# Altium footprint library KwantLib.PcbLib: 249 footprints (part 2 of 16)
Each footprint in its own frame and in the unit in brackets; x right, y up, seen from the top. Pads: shape width x height; smd on the part's side, far side on the other; paste and mask are expansions set on the pad; w line width, h text height; cw(c..) or ccw(c..) is an arc to the next point about the centre after c.
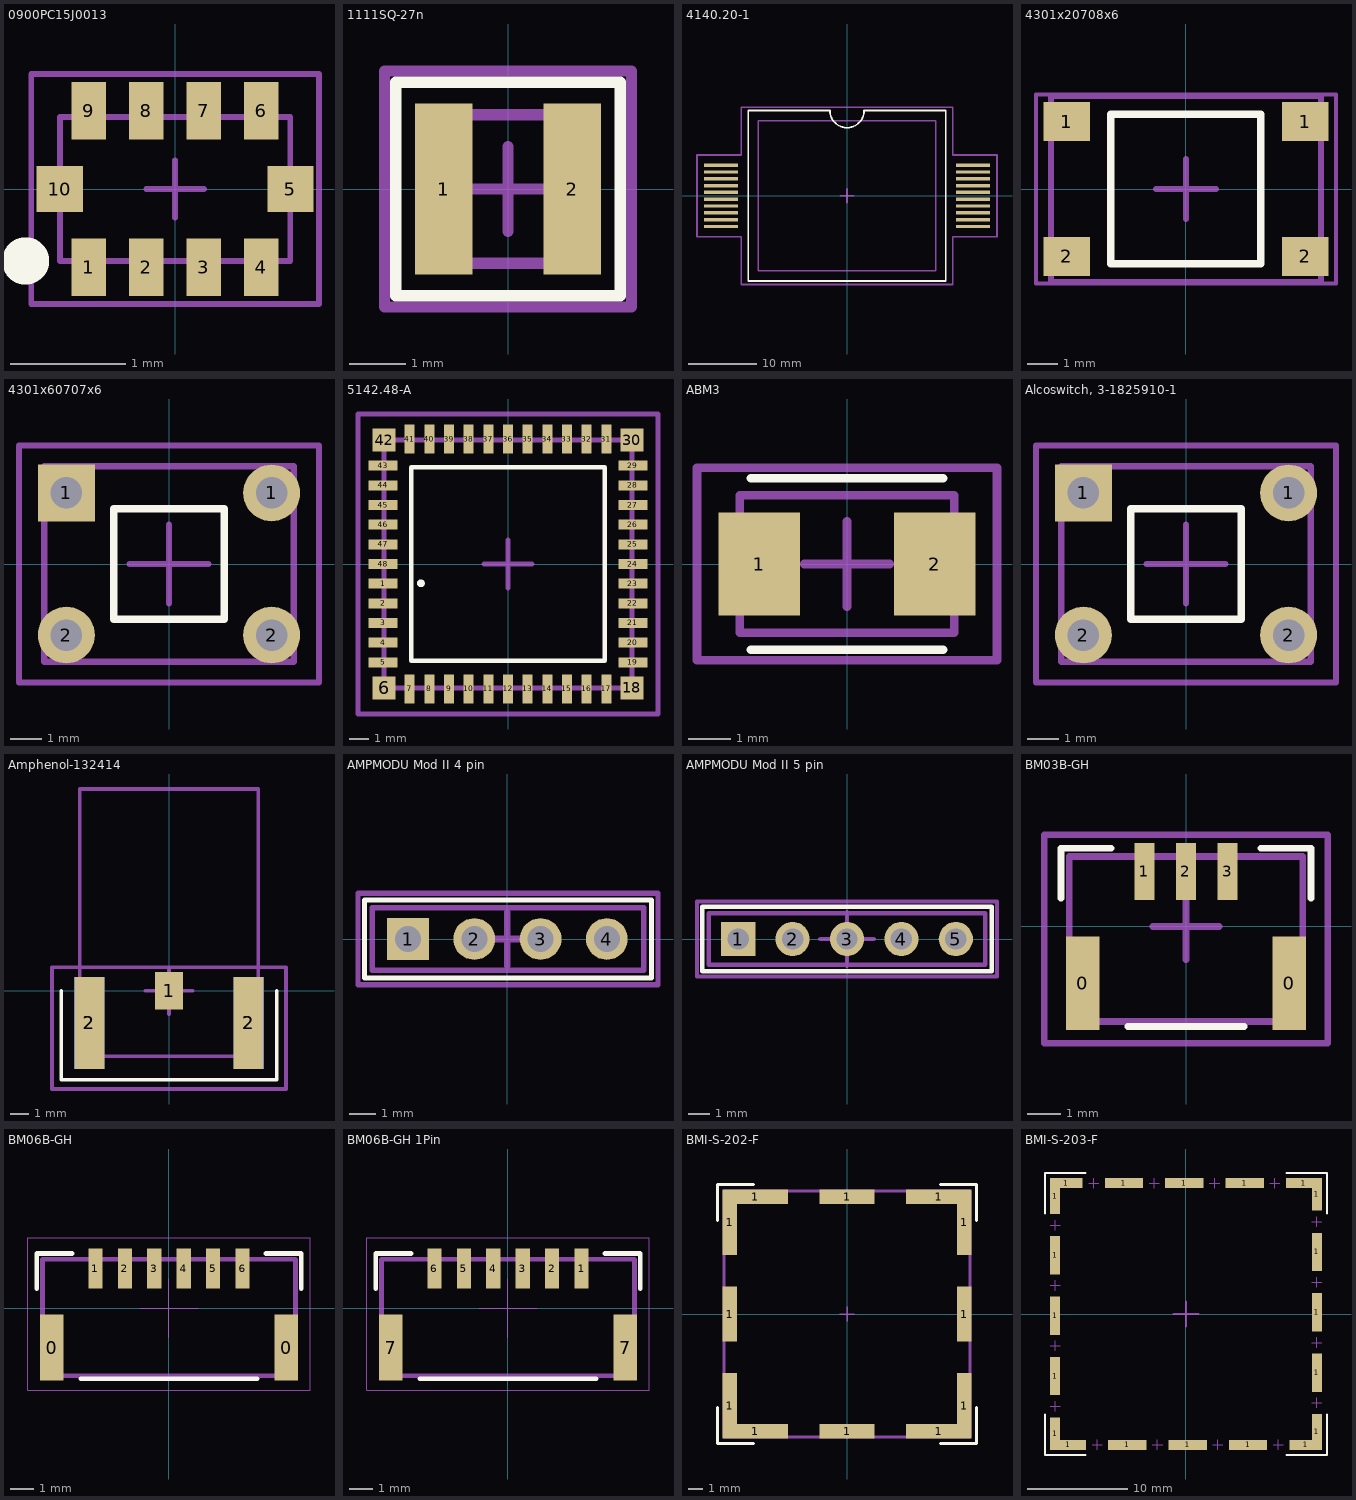
[diagram p1: the footprints below, top view; thin cyan lines are the x and y axes]

## 0900PC15J0013 [mm]
height 1
pads (10):
  rect 0.3x0.5 smd mask+0.07: 1(-0.75,-0.68) 2(-0.25,-0.68) 3(0.25,-0.68) 4(0.75,-0.68) 6(0.75,0.68) 7(0.25,0.68) 8(-0.25,0.68) 9(-0.75,0.68)
  rect 0.4x0.4 smd mask+0.07: 5(1.002,0) 10(-1.002,0)
Top Overlay:
  circle w0.3: c-1.3,-0.625 r0.056
Mechanical 13:
  lines w0.05: -1,-0.625 1,-0.625 1,0.625 -1,0.625 -1,-0.625
Mechanical 15:
  lines w0.05: -0.25,0 0.25,0 ; 0,-0.25 0,0.25 ; -1.25,-1 1.25,-1 1.25,1 -1.25,1 -1.25,-1
3D body "0900PC15J0013.stp": height 1.02, standoff 0, extent -1.01,-0.635 1.01,0.635

## 1111SQ-27n [mm] "Square Air Core Inductor - 27 nH"
height 3
pads (2):
  rect 1.02x3.05 smd: 1(-1.145,0) 2(1.145,0)
Top Overlay:
  lines w0.2: -2,-1.9 -2,1.9 2,1.9 2,-1.9 -2,-1.9
Mechanical 13:
  lines w0.2: -1.317,-1.321 1.318,-1.321 1.318,1.321 -1.317,1.321 -1.317,-1.321
Mechanical 15:
  lines w0.2: -0.75,0 0.75,0 ; 0,-0.75 0,0.75 ; -2.2,-2.1 2.2,-2.1 2.2,2.1 -2.2,2.1 -2.2,-2.1
3D body "1111SQ-27N.stp": height 2.82, standoff 0, extent -1.317,-1.321 1.318,1.321

## 4140.20-1 [mm]
height 7.12
pads (20):
  rect 5x0.5 smd: 1(-18.5,4.5) 2(-18.5,3.5) 3(-18.5,2.5) 4(-18.5,1.5) 5(-18.5,0.5) 6(-18.5,-0.5) 7(-18.5,-1.5) 8(-18.5,-2.5) 9(-18.5,-3.5) 10(-18.5,-4.5) 11(18.5,-4.5) 12(18.5,-3.5) 13(18.5,-2.5) 14(18.5,-1.5) 15(18.5,-0.5) 16(18.5,0.5) 17(18.5,1.5) 18(18.5,2.5) 19(18.5,3.5) 20(18.5,4.5)
Top Overlay:
  lines w0.25: -14.5,-12.5 14.5,-12.5 14.5,12.5 2.5,12.5 cw(c0,12.5) -2.5,12.5 -14.5,12.5 -14.5,-12.5
Mechanical 13:
  lines w0.25: -13,-11 13,-11 13,-3 13,11 -13,11 -13,-11
Mechanical 15:
  lines w0.25: -1,0 1,0 ; 0,-1 0,1 ; -22,-6 -15.5,-6 -15.5,-13 15.5,-13 15.5,-6 22,-6 22,6 15.5,6 15.5,13 -15.5,13 -15.5,6 -22,6 -22,-6
3D body: height 7.12, standoff 0.1, extent -13,-11 13,11

## 4301x20708x6 [mm] "6*6mm vertical type, SMD, height 7.0mm, white actuator, 260gf, T&R"
height 7
pads (4):
  rect 1.55x1.3 smd: 1(-3.975,2.25) 1(3.975,2.25) 2(-3.975,-2.25) 2(3.975,-2.25)
Top Overlay:
  lines w0.25: -2.5,-2.5 2.5,-2.5 2.5,2.5 -2.5,2.5 -2.5,-2.5
Mechanical 13:
  lines w0.2: -4.5,-3.1 -4.5,3.1 4.5,3.1 4.5,-3.1 -4.5,-3.1
Mechanical 15:
  lines w0.127: -5,-3.15 -5,3.15 5,3.15 5,-3.15 -5,-3.15
  lines w0.2: -1,0 1,0 ; 0,-1 0,1
3D body "4301x20708x6.stp": height 6.99, standoff -0.01, extent -4.5,-3.1 4.5,3.1

## 4301x60707x6 [mm] "6*6mm vertical type, THT, height 7.0mm, white actuator, 260gf, Bulk"
height 7
pads (4):
  rect 1.8x1.8 hole 1: 1(-3.25,2.25)
  round 1.8 hole 1: 1(3.25,2.25) 2(-3.25,-2.25) 2(3.25,-2.25)
Top Overlay:
  lines w0.25: -1.75,-1.75 -1.75,1.75 1.75,1.75 1.75,-1.75 -1.75,-1.75
Mechanical 13:
  lines w0.2: -3.947,-3.1 -3.947,3.1 3.947,3.1 3.947,-3.1 -3.947,-3.1
Mechanical 15:
  lines w0.2: -1.25,0 1.25,0 ; 0,-1.25 0,1.25 ; -4.75,-3.75 4.75,-3.75 4.75,3.75 -4.75,3.75 -4.75,-3.75
3D body "4301x60707x6.stp": height 7.01, standoff -3.49, extent -3.947,-3.1 3.947,3.1

## 5142.48-A [mm]
height 2.5
pads (48):
  rect 1.5x0.52 smd: 1(-6.45,-1.016) 2(-6.45,-2.032) 3(-6.45,-3.048) 4(-6.45,-4.064) 5(-6.45,-5.08) 19(6.45,-5.08) 20(6.45,-4.064) 21(6.45,-3.048) 22(6.45,-2.032) 23(6.45,-1.016) 24(6.45,0) 25(6.45,1.016) 26(6.45,2.032) 27(6.45,3.048) 28(6.45,4.064) 29(6.45,5.08) 43(-6.45,5.08) 44(-6.45,4.064) 45(-6.45,3.048) 46(-6.45,2.032) 47(-6.45,1.016) 48(-6.45,0)
  rect 1.2x1.2 smd: 6(-6.4,-6.4) 18(6.4,-6.4) 30(6.4,6.4) 42(-6.4,6.4)
  rect 0.52x1.5 smd: 7(-5.08,-6.45) 8(-4.064,-6.45) 9(-3.048,-6.45) 10(-2.032,-6.45) 11(-1.016,-6.45) 12(0,-6.45) 13(1.016,-6.45) 14(2.032,-6.45) 15(3.048,-6.45) 16(4.064,-6.45) 17(5.08,-6.45) 31(5.08,6.45) 32(4.064,6.45) 33(3.048,6.45) 34(2.032,6.45) 35(1.016,6.45) 36(0,6.45) 37(-1.016,6.45) 38(-2.032,6.45) 39(-3.048,6.45) 40(-4.064,6.45) 41(-5.08,6.45)
Top Overlay:
  circle w0.2: c-4.5,-1 r0.1
  lines w0.25: -5,-5 -5,5 5,5 5,-5 -5,-5
Mechanical 13:
  lines w0.25: -6.4,-6.4 6.4,-6.4 6.4,6.4 -6.4,6.4 -6.4,-6.4
Mechanical 15:
  lines w0.25: -1.25,0 1.25,0 ; 0,-1.25 0,1.25 ; -7.75,-7.75 -7.75,7.75 7.75,7.75 7.75,-7.75 -7.75,-7.75
3D body "514248а.STEP": height 2.5, standoff 0, extent -6.4,-6.35 6.3,6.35

## ABM3 [mm]
height 1.3
pads (2):
  rect 1.9x2.4 smd: 1(-2.05,0) 2(2.05,0)
Top Overlay:
  lines w0.2: -2.25,-2 2.25,-2 ; -2.25,2 2.25,2
Mechanical 13:
  lines w0.2: -2.5,-1.6 2.5,-1.6 2.5,1.6 -2.5,1.6 -2.5,-1.6
Mechanical 15:
  lines w0.2: -1,0 1,0 ; 0,-1 0,1 ; -3.5,-2.25 -3.5,2.25 3.5,2.25 3.5,-2.25 -3.5,-2.25
3D body "ABM3.STEP": height 1.31, standoff 0.01, extent -2.5,-1.6 2.5,1.6

## Alcoswitch, 3-1825910-1 [mm] "6*6mm vertical type, THT, height 17 mm, 160gf, Bulk"
height 17
pads (4):
  rect 1.8x1.8 hole 1: 1(-3.25,2.25)
  round 1.8 hole 1: 1(3.25,2.25) 2(-3.25,-2.25) 2(3.25,-2.25)
Top Overlay:
  lines w0.25: -1.75,-1.75 1.75,-1.75 1.75,1.75 -1.75,1.75 -1.75,-1.75
Mechanical 13:
  lines w0.2: -3.947,-3.1 3.947,-3.1 3.947,3.1 -3.947,3.1 -3.947,-3.1
Mechanical 15:
  lines w0.2: -1.25,0 1.25,0 ; 0,-1.25 0,1.25 ; -4.75,-3.75 -4.75,3.75 4.75,3.75 4.75,-3.75 -4.75,-3.75
3D body "c-3-1825910-1-c-3d.stp": height 17, standoff -3.51, extent -3.9,-2.995 3.9,2.995

## Amphenol-132414 [mm] "SMA Edge connector"
pads (5):
  rect 1.5x2 smd: 1(0,0)
  rect 1.6x4.9 smd: 2(-4.25,-1.725) 2(4.25,-1.725)
  rect 1.6x4.9 smd far side: 2(-4.25,-1.725) 2(4.25,-1.725)
Top Overlay:
  lines w0.2: -5.75,0 -5.75,-4.75 5.75,-4.75 5.75,0
Mechanical 13:
  lines w0.2: -4.76,-3.5 4.76,-3.5 4.76,10.77 -4.76,10.77 -4.76,-3.5
Mechanical 15:
  lines w0.2: -1.25,0 1.25,0 ; 0,-1.25 0,1.25 ; -6.25,-5.25 -6.25,1.25 6.25,1.25 6.25,-5.25 -6.25,-5.25
3D body "Amphenol-132414.stp": height 4.06, standoff -3.86, extent -4.76,-3.5 4.76,10.77

## AMPMODU Mod II 4 pin [mm]
pads (4):
  rect 1.6x1.6 hole 1: 1(-3.81,0)
  round 1.6 hole 1: 2(-1.27,0) 3(1.27,0) 4(3.81,0)
Top Overlay:
  lines w0.2: -5.48,-1.5 5.52,-1.5 5.52,1.5 -5.48,1.5 -5.48,-1.5
Mechanical 13:
  lines w0.2: -5.18,-1.2 5.22,-1.2 5.22,1.2 -5.18,1.2 -5.18,-1.2
Mechanical 15:
  lines w0.2: -5.73,-1.75 -5.73,1.75 5.77,1.75 5.77,-1.75 -5.73,-1.75
  lines w0.25: -1.016,0 1.016,0 ; 0,-1.016 0,1.016
3D body "PLD-4.stp": height 8, standoff -3, extent -5.08,-1.27 5.08,1.27

## AMPMODU Mod II 5 pin [mm]
pads (5):
  rect 1.6x1.6 hole 1: 1(-5.08,0)
  round 1.6 hole 1: 2(-2.54,0) 3(0,0) 4(2.54,0) 5(5.08,0)
Top Overlay:
  lines w0.2: -6.75,-1.5 6.75,-1.5 6.75,1.5 -6.75,1.5 -6.75,-1.5
Mechanical 13:
  lines w0.2: -6.45,-1.2 6.45,-1.2 6.45,1.2 -6.45,1.2 -6.45,-1.2
Mechanical 15:
  lines w0.2: -1.25,0 1.25,0 ; 0,-1.25 0,1.25 ; -7,-1.75 -7,1.75 7,1.75 7,-1.75 -7,-1.75
3D body "PLD-5.stp": height 8, standoff -3, extent -6.35,-1.27 6.35,1.27

## BM03B-GH [mm]
height 4.05
pads (5):
  rect 1x2.8 smd: 0(-3.1,-1.7) 0(3.1,-1.7)
  rect 0.6x1.7 smd: 1(-1.25,1.65) 2(0,1.65) 3(1.25,1.65)
Top Overlay:
  lines w0.2: -3.75,0.85 -3.75,2.35 -2.25,2.35 ; -1.75,-3 1.75,-3 ; 2.25,2.35 3.75,2.35 3.75,0.85
Mechanical 13:
  lines w0.2: -3.5,-2.85 -3.5,2.1 3.5,2.1 3.5,-2.85 -3.5,-2.85
Mechanical 15:
  lines w0.2: -1,0 1,0 ; 0,-1 0,1 ; -4.25,-3.5 4.25,-3.5 4.25,2.75 -4.25,2.75 -4.25,-3.5
3D body "BM03B-GHS-TBT.STEP": height 4.18, standoff -0.03, extent -3.5,-2.85 3.5,2.1

## BM06B-GH [mm]
height 4.05
pads (8):
  rect 1x2.8 smd paste-0.05: 0(-4.975,-1.675) 0(4.975,-1.675)
  rect 0.6x1.7 smd paste-0.05: 1(-3.125,1.675) 2(-1.875,1.675) 3(-0.625,1.675) 4(0.625,1.675) 5(1.875,1.675) 6(3.125,1.675)
Top Overlay:
  lines w0.2: -5.625,0.825 -5.625,2.325 -4.125,2.325 ; -3.75,-3 3.75,-3 ; 4.125,2.325 5.625,2.325 5.625,0.825
Mechanical 13:
  lines w0.2: -5.375,-2.875 -5.375,2.075 5.375,2.075 5.375,-2.875 -5.375,-2.875
Mechanical 15:
  lines w0.05: -1.25,0 1.25,0 ; 0,-1.25 0,1.25 ; -6,-3.5 6,-3.5 6,3 -6,3 -6,-3.5
3D body "BM06B-GHS-TBT.STEP": height 4.18, standoff -0.03, extent -5.375,-2.875 5.375,2.075

## BM06B-GH 1Pin [mm] "BM06B-GH С правильным расположением выводов"
height 4.05
pads (8):
  rect 0.6x1.7 smd paste-0.05: 1(3.125,1.675) 2(1.875,1.675) 3(0.625,1.675) 4(-0.625,1.675) 5(-1.875,1.675) 6(-3.125,1.675)
  rect 1x2.8 smd paste-0.05: 7(-4.975,-1.675) 7(4.975,-1.675)
Top Overlay:
  lines w0.2: -5.625,0.825 -5.625,2.325 -4.125,2.325 ; -3.75,-3 3.75,-3 ; 4.125,2.325 5.625,2.325 5.625,0.825
Mechanical 13:
  lines w0.2: -5.375,-2.875 -5.375,2.075 5.375,2.075 5.375,-2.875 -5.375,-2.875
Mechanical 15:
  lines w0.05: -1.25,0 1.25,0 ; 0,-1.25 0,1.25 ; -6,-3.5 6,-3.5 6,3 -6,3 -6,-3.5
3D body "BM06B-GHS-TBT.STEP": height 4.18, standoff -0.03, extent -5.375,-2.875 5.375,2.075

## BMI-S-202-F [mm] "EMI Shield"
height 3.6
pads (12):
  rect 1x4.55 smd paste-0.07 mask+0.07: 1(-8.15,-6.375) 1(-8.15,6.375) 1(8.15,-6.375) 1(8.15,6.375)
  rect 1x3.8 smd paste-0.07 mask+0.07: 1(-8.15,0) 1(8.15,0)
  rect 4.55x1 smd paste-0.07 mask+0.07: 1(-6.375,-8.15) 1(-6.375,8.15) 1(6.375,-8.15) 1(6.375,8.15)
  rect 3.8x1 smd paste-0.07 mask+0.07: 1(0,-8.15) 1(0,8.15)
Top Overlay:
  lines w0.2: -9,-6.5 -9,-9 -6.5,-9 ; -9,6.5 -9,9 -6.5,9 ; 6.5,-9 9,-9 9,-6.5 ; 6.5,9 9,9 9,6.5
Mechanical 13:
  lines w0.2: -8.549,-8.549 -8.549,8.55 8.55,8.55 8.55,-8.549 -8.549,-8.549
Mechanical 15:
  lines w0.1: -0.5,0 0.5,0 ; 0,-0.5 0,0.5
3D body "Laird-BMI-S-202-F+C.stp": height 3.76, standoff 0.01, extent -8.549,-8.549 8.55,8.55

## BMI-S-203-F [mm] "EMI Shield"
height 5.08
pads (20):
  rect 1x3.24 smd paste-2 mask+0.1: 1(-13.005,-11.885) 1(13.005,11.885)
  rect 1x3.8 smd paste-2 mask+0.1: 1(-13.005,-6.165) 1(-13.005,-0.165) 1(-13.005,5.835) 1(13.005,-5.835) 1(13.005,0.165) 1(13.005,6.165)
  rect 1x3.57 smd paste-2 mask+0.1: 1(-13.005,11.72) 1(13.005,-11.72)
  rect 3.24x1 smd paste-2 mask+0.1: 1(-11.885,13.005) 1(11.885,-13.005)
  rect 3.57x1 smd paste-2 mask+0.1: 1(-11.72,-13.005) 1(11.72,13.005)
  rect 3.8x1 smd paste-2 mask+0.1: 1(-6.165,13.005) 1(-5.835,-13.005) 1(-0.165,13.005) 1(0.165,-13.005) 1(5.835,13.005) 1(6.165,-13.005)
Top Overlay:
  lines w0.2: -14,-10 -14,-14 -10,-14 ; -14,10 -14,14 -10,14 ; 10,-14 14,-14 14,-10 ; 10,14 14,14 14,10
Mechanical 13:
  lines w0.05: -13.505,-9.165 -12.505,-9.165 ; -13.505,-3.165 -12.505,-3.165 ; -13.505,2.835 -12.505,2.835 ; -13.505,8.835 -12.505,8.835 ; -13.005,-9.665 -13.005,-8.665 ; -13.005,-3.665 -13.005,-2.665 ; -13.005,2.335 -13.005,3.335 ; -13.005,8.335 -13.005,9.335 ; -9.665,13.005 -8.665,13.005 ; -9.335,-13.005 -8.335,-13.005 ; -9.165,12.505 -9.165,13.505 ; -8.835,-13.505 -8.835,-12.505 ; -3.665,13.005 -2.665,13.005 ; -3.335,-13.005 -2.335,-13.005 ; -3.165,12.505 -3.165,13.505 ; -2.835,-13.505 -2.835,-12.505 ; 2.335,13.005 3.335,13.005 ; 2.665,-13.005 3.665,-13.005 ; 2.835,12.505 2.835,13.505 ; 3.165,-13.505 3.165,-12.505 ; 8.335,13.005 9.335,13.005 ; 8.665,-13.005 9.665,-13.005 ; 8.835,12.505 8.835,13.505 ; 9.165,-13.505 9.165,-12.505 ; 12.505,-8.835 13.505,-8.835 ; 12.505,-2.835 13.505,-2.835 ; 12.505,3.165 13.505,3.165 ; 12.505,9.165 13.505,9.165 ; 13.005,-9.335 13.005,-8.335 ; 13.005,-3.335 13.005,-2.335 ; 13.005,2.665 13.005,3.665 ; 13.005,8.665 13.005,9.665
Mechanical 15:
  lines w0.2: -1.25,0 1.25,0 ; 0,-1.25 0,1.25
3D body "BMI-S-203-F Norm.stp": height 5.31, standoff 0, extent -13.41,-13.404 13.41,13.41